# Altium footprint library Power_Lib_Altium.PcbLib: 383 footprints (part 15 of 24)
Each footprint in its own frame and in the unit in brackets; x right, y up, seen from the top. Pads: shape width x height; smd on the part's side, far side on the other; paste and mask are expansions set on the pad; w line width, h text height; cw(c..) or ccw(c..) is an arc to the next point about the centre after c.
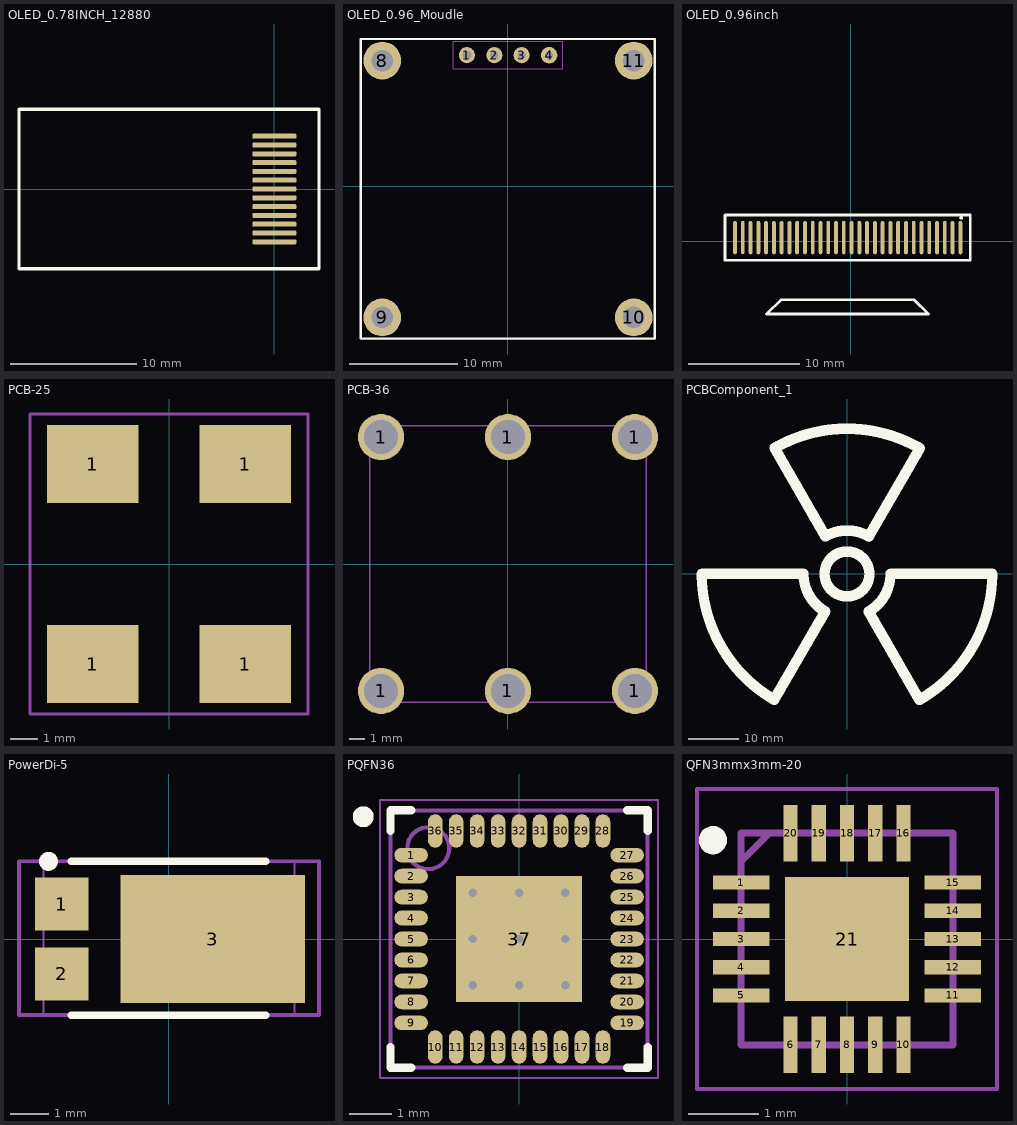
[diagram p14: the footprints below, top view; thin cyan lines are the x and y axes]

## OLED_0.78INCH_12880 [mm]
pads (13):
  rrect50% 3.5x0.4 smd: 1(0,-4.2) 2(0,-3.5) 3(0,-2.8) 4(0,-2.1) 5(0,-1.4) 6(0,-0.7) 7(0,0) 8(0,0.7) 9(0,1.4) 10(0,2.1) 11(0,2.8) 12(0,3.5) 13(0,4.2)
Top Overlay:
  lines w0.254: -20.32,-6.35 3.556,-6.35 3.556,6.35 -20.32,6.35 -20.32,-6.35
3D body "Ctrl-DualBoard-Down v1.step": height 1.55, standoff 0.09, extent -20.182,-6.25 7.54,6.25

## OLED_0.96_Moudle [mm]
pads (8):
  round 1.5 hole 0.813: 1(-3.81,12.15) 2(-1.27,12.15) 3(1.27,12.15)
  round 1.524 hole 0.762: 4(3.81,12.15)
  round 3.5 hole 2: 8(-11.65,11.65) 9(-11.65,-12.15) 10(11.65,-12.15) 11(11.65,11.65)
Top Overlay:
  lines w0.2: -13.65,-14.1 13.6,-14.1 13.6,13.65 -13.65,13.65 -13.65,-14.1
Mechanical 13:
  lines w0.051: -5.08,10.88 -5.08,13.42 5.08,13.42 5.08,10.88 -5.08,10.88
Mechanical 14:
  lines w0.051: -13.65,-14.15 13.65,-14.15 13.65,13.65 -13.65,13.65 -13.65,-14.15 ; -5.08,10.88 5.08,10.88 5.08,13.42 -5.08,13.42 -5.08,10.88
3D body "0.96 OLED v3.step": height 10.5, standoff -0.5, extent -14,-14 14,14
3D body: height 7.4, standoff 0, extent -5.08,11.236 5.08,14.004

## OLED_0.96inch [mm]
pads (30):
  oval 0.35x3 smd: 1(9.889,0.32) 2(9.189,0.32) 3(8.489,0.32) 4(7.789,0.32) 5(7.089,0.32) 6(6.389,0.32) 7(5.689,0.32) 8(4.989,0.32) 9(4.289,0.32) 10(3.589,0.32) 11(2.889,0.32) 12(2.189,0.32) 13(1.489,0.32) 14(0.789,0.32) 15(0.089,0.32) 16(-0.611,0.32) 17(-1.311,0.32) 18(-2.011,0.32) 19(-2.711,0.32) 20(-3.411,0.32) 21(-4.111,0.32) 22(-4.811,0.32) 23(-5.511,0.32) 24(-6.211,0.32) 25(-6.911,0.32) 26(-7.611,0.32) 27(-8.311,0.32) 28(-9.011,0.32) 29(-9.711,0.32) 30(-10.411,0.32)
Top Overlay:
  lines w0.254: -7.561,-6.564 7.018,-6.564 5.738,-5.283 -6.28,-5.283 -7.469,-6.472 ; 9.889,2.098 10.016,2.098 ; -11.32,-1.712 10.778,-1.712 10.778,2.352 -11.32,2.352 -11.32,-1.712
Bottom Overlay:
  lines w0.254: -13.835,-1.586 -13.835,15.966 -12.641,15.966 -8.145,15.966 ; -13.81,-1.611 13.165,-1.611 ; 7.476,15.966 13.165,15.966 ; 13.191,-1.636 13.191,15.94
  text "0.96'OLED" at 2.21,15.342 h1.27
3D body "User Library-096OLED.SLDPRT": height 1.44, standoff -2.4, extent -13.579,-6.165 13.121,16.052

## PCB-25 [mm] "接线端子 86A"
pads (4):
  rect 3.3x2.8 smd: 1(-2.75,-3.6) 1(-2.75,3.6) 1(2.75,-3.6) 1(2.75,3.6)
Mechanical 15:
  lines w0.1: -5,-5.4 5,-5.4 5,5.4 -5,5.4 -5,-5.4

## PCB-36 [mm] "接线端子 180A"
pads (6):
  round 3 hole 2.2: 1(-8.25,-8.25) 1(-8.25,8.25) 1(0,-8.25) 1(0,8.25) 1(8.25,-8.25) 1(8.25,8.25)
Mechanical 15:
  lines w0.1: -9,-9 -9,9 9,9 9,-9 -9,-9

## PCBComponent_1 [mm]
Top Overlay:
  drawing of 6367 lines, arcs and shapes, not listed

## PCBComponent_1 - duplicate [mm]

## PCBComponent_1 - duplicate1 [mm]

## PCBComponent_1 - duplicate2 [mm]

## PCBComponent_1 - duplicate3 [mm]

## PCBComponent_1 - duplicate4 [mm]

## PCBComponent_1 - duplicate5 [mm]

## PCBComponent_1 - duplicate6 [mm]

## PowerDi-5 [mm]
pads (3):
  rect 1.4x1.39 smd: 1(-2.825,0.92) 2(-2.825,-0.92)
  rect 4.86x3.36 smd: 3(1.157,0)
Top Overlay:
  circle w0.25: c-3.175,2.045 r0.125
  lines w0.2: -2.575,-2.005 2.55,-2.005 ; -2.575,2.045 2.55,2.045
Mechanical 13:
  lines w0.051: -0.254,0 0.254,0 ; 0,-0.254 0,0.254 ; -3.3,-2.005 -3.3,2.045 3.3,2.045 3.3,-2.005 -3.3,-2.005
Mechanical 14:
  lines w0.1: -3.95,-2.005 3.95,-2.005 3.95,2.045 -3.95,2.045 -3.95,-2.005
3D body "PowerDI-5.STEP": height 1.17, standoff 0.02, extent -3.3,-2.005 3.3,2.045

## PQFN36 [mm] "PQFN, 36-Leads, Body 6.00x6.00mm, Pitch 0.50mm, Thermal Pad 3.00x3.00mm, IPC Medium Density"
height 1
pads (37):
  oval 0.8x0.35 smd: 1(-2.575,2) 2(-2.575,1.5) 3(-2.575,1) 4(-2.575,0.5) 5(-2.575,0) 6(-2.575,-0.5) 7(-2.575,-1) 8(-2.575,-1.5) 9(-2.575,-2) 19(2.575,-2) 20(2.575,-1.5) 21(2.575,-1) 22(2.575,-0.5) 23(2.575,0) 24(2.575,0.5) 25(2.575,1) 26(2.575,1.5) 27(2.575,2)
  oval 0.35x0.8 smd: 10(-2,-2.575) 11(-1.5,-2.575) 12(-1,-2.575) 13(-0.5,-2.575) 14(0,-2.575) 15(0.5,-2.575) 16(1,-2.575) 17(1.5,-2.575) 18(2,-2.575) 28(2,2.575) 29(1.5,2.575) 30(1,2.575) 31(0.5,2.575) 32(0,2.575) 33(-0.5,2.575) 34(-1,2.575) 35(-1.5,2.575) 36(-2,2.575)
  rect 3x3 smd: 37(0,0)
via 1.1,-1.1 diameter 0.5 hole 0.2
via 0,-1.1 diameter 0.5 hole 0.2
via -1.1,-1.1 diameter 0.5 hole 0.2
via 1.1,0 diameter 0.5 hole 0.2
via 0,0 diameter 0.5 hole 0.2
via -1.1,0 diameter 0.5 hole 0.2
via 1.1,1.1 diameter 0.5 hole 0.2
via 0,1.1 diameter 0.5 hole 0.2
via -1.1,1.1 diameter 0.5 hole 0.2
Top Overlay:
  circle w0.25: c-3.715,2.915 r0.125
  lines w0.2: -3.065,-2.575 -3.065,-3.065 -2.575,-3.065 ; -3.065,2.575 -3.065,3.065 -2.575,3.065 ; 2.575,-3.065 3.065,-3.065 3.065,-2.575 ; 2.575,3.065 3.065,3.065 3.065,2.575
Mechanical 13:
  circle w0.1: c-2.165,2.165 r0.5
  lines w0.1: -3.065,-3.065 3.065,-3.065 3.065,3.065 -3.065,3.065 -3.065,-3.065
Mechanical 15:
  lines w0.05: -3.313,-3.312 3.312,-3.312 3.312,3.313 -3.313,3.313 -3.313,-3.312
  lines w0.1: -0.5,0 0.5,0 ; 0,-0.5 0,0.5
3D body: height 1, standoff 0.05, extent -3.065,-3.065 3.065,3.065

## QFN3mmx3mm-20 [mm]
pads (21):
  rect 0.8x0.2 smd: 1(-1.5,0.8) 2(-1.5,0.4) 3(-1.5,0) 4(-1.5,-0.4) 5(-1.5,-0.8) 11(1.5,-0.8) 12(1.5,-0.4) 13(1.5,0) 14(1.5,0.4) 15(1.5,0.8)
  rect 0.2x0.8 smd: 6(-0.8,-1.5) 7(-0.4,-1.5) 8(0,-1.5) 9(0.4,-1.5) 10(0.8,-1.5) 16(0.8,1.5) 17(0.4,1.5) 18(0,1.5) 19(-0.4,1.5) 20(-0.8,1.5)
  rect 1.75x1.75 smd: 21(0,0)
Top Overlay:
  circle w0.2: c-1.9,1.4 r0.1
Mechanical 13:
  lines w0.1: -1.5,1.1 -1.1,1.5 ; -1.5,-1.5 1.5,-1.5 1.5,1.5 -1.5,1.5 -1.5,-1.5
Mechanical 15:
  lines w0.05: -2.125,-2.125 2.125,-2.125 2.125,2.125 -2.125,2.125 -2.125,-2.125
3D body "EA3036QBR.stp": height 0.8, standoff 0, extent -1.55,-1.55 1.55,1.55